# Altium footprint library RODION.PcbLib: 131 footprints (part 8 of 9)
Each footprint in its own frame and in the unit in brackets; x right, y up, seen from the top. Pads: shape width x height; smd on the part's side, far side on the other; paste and mask are expansions set on the pad; w line width, h text height; cw(c..) or ccw(c..) is an arc to the next point about the centre after c.
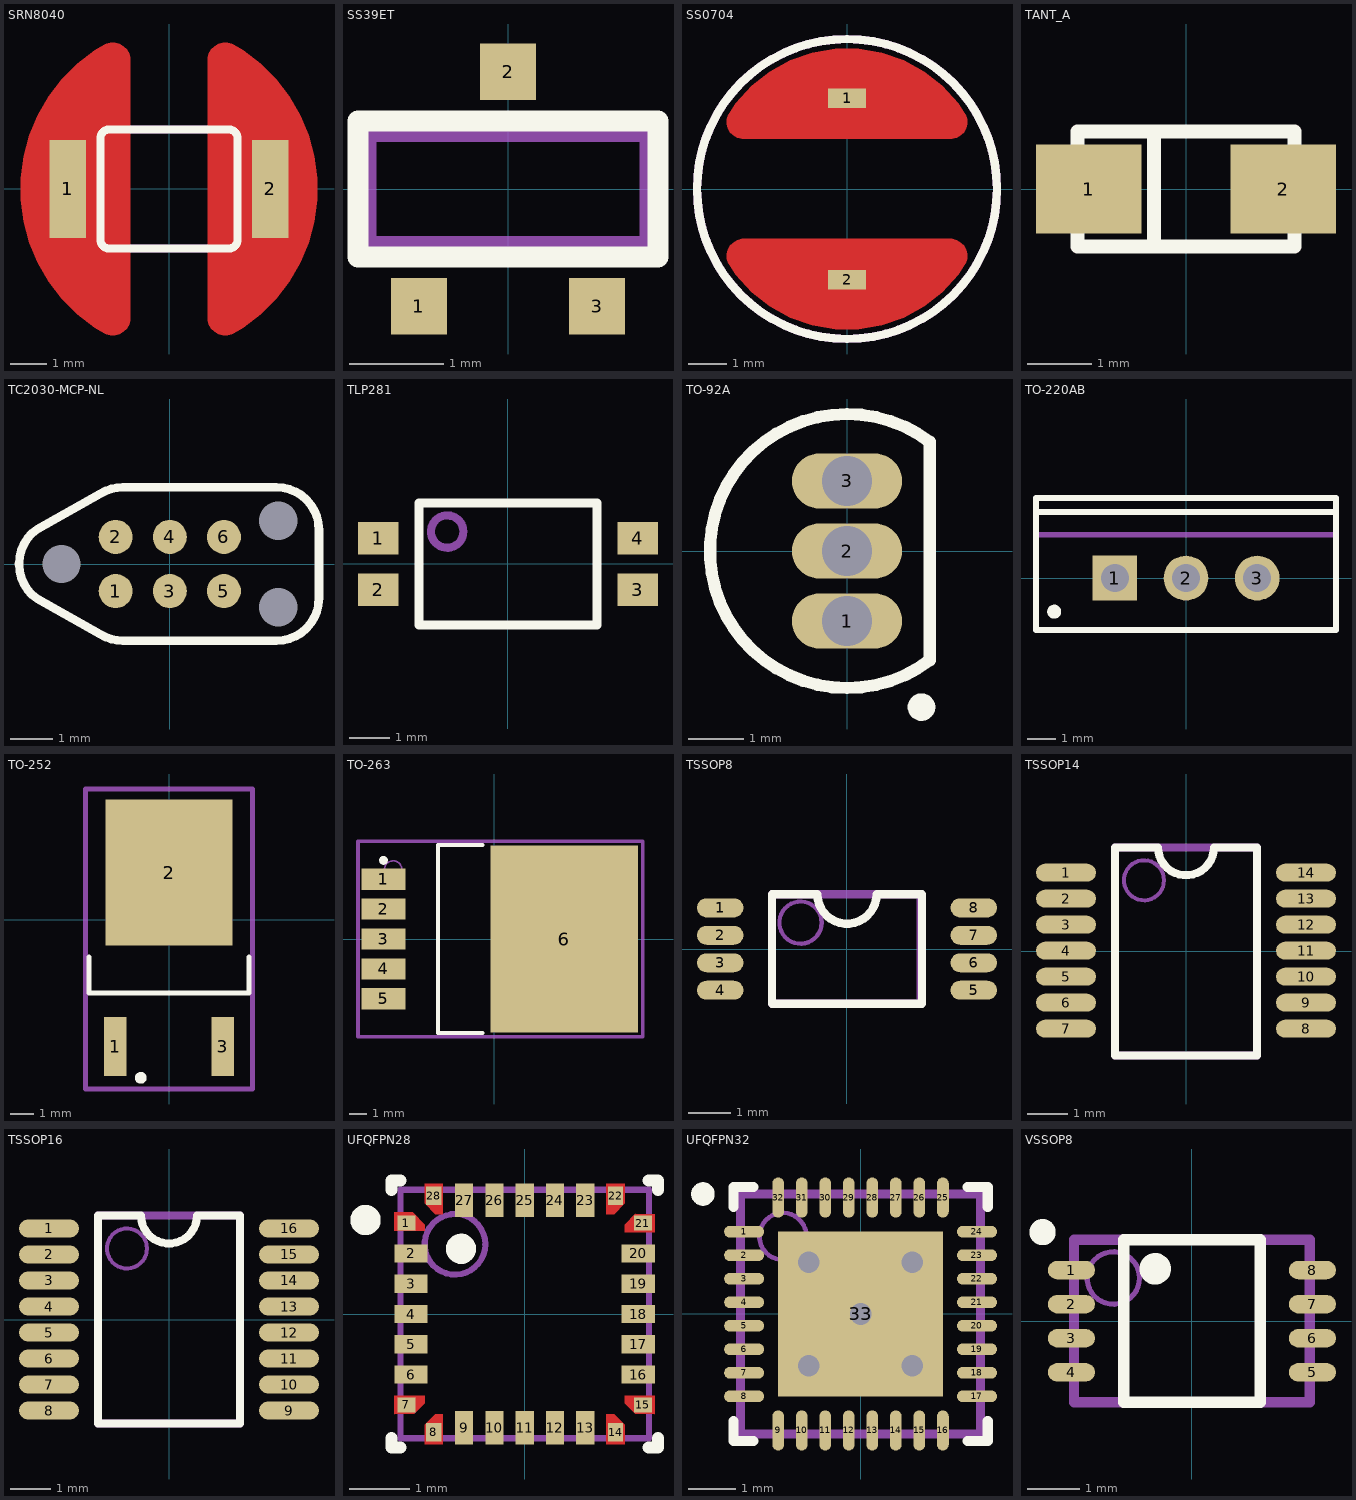
[diagram p7: the footprints below, top view; thin cyan lines are the x and y axes]

## SRN8040 [mm] "Chip Inductor, Body 8mm"
height 4
pads (2):
  rect 1x2.7 smd: 1(-2.8,0) 2(2.8,0)
Top Layer:
  region: 1.797,-3.985 2.059,-3.835 2.538,-3.468 2.964,-3.041 3.332,-2.563 3.634,-2.04 3.865,-1.483 4.021,-0.9 4.1,-0.302 4.1,0.302 4.021,0.9 3.865,1.483 3.634,2.04 3.332,2.563 2.964,3.041 2.538,3.468 2.059,3.835 1.797,3.985 1.742,4.017 1.619,4.05 1.492,4.05 1.37,4.017 1.26,3.953 1.17,3.863 1.106,3.753 1.073,3.631 1.073,3.567 1.073,-3.567 1.073,-3.631 1.106,-3.753 1.17,-3.863 1.26,-3.953 1.37,-4.017 1.492,-4.05 1.619,-4.05 1.742,-4.017
  region: -1.797,-3.985 -2.059,-3.835 -2.538,-3.468 -2.964,-3.041 -3.332,-2.563 -3.634,-2.04 -3.865,-1.483 -4.021,-0.9 -4.1,-0.302 -4.1,0.302 -4.021,0.9 -3.865,1.483 -3.634,2.04 -3.332,2.563 -2.964,3.041 -2.538,3.468 -2.059,3.835 -1.797,3.985 -1.742,4.017 -1.619,4.05 -1.492,4.05 -1.37,4.017 -1.26,3.953 -1.17,3.863 -1.106,3.753 -1.073,3.631 -1.073,3.567 -1.073,-3.567 -1.073,-3.631 -1.106,-3.753 -1.17,-3.863 -1.26,-3.953 -1.37,-4.017 -1.492,-4.05 -1.619,-4.05 -1.742,-4.017
Top Overlay:
  lines w0.22: -1.7,-1.65 1.7,-1.65 ; -1.7,1.65 1.7,1.65 ; -1.65,-1.65 cw(c-1.65,-1.4) -1.9,-1.4 -1.9,1.4 cw(c-1.65,1.4) -1.65,1.65 ; 1.65,-1.65 ccw(c1.65,-1.4) 1.9,-1.4 1.9,1.4 ccw(c1.65,1.4) 1.65,1.65
Top_Assy:
  lines w0.22: -1.7,-1.65 1.7,-1.65 ; -1.7,1.65 1.7,1.65 ; -1.65,-1.65 cw(c-1.65,-1.4) -1.9,-1.4 -1.9,1.4 cw(c-1.65,1.4) -1.65,1.65 ; 1.65,-1.65 ccw(c1.65,-1.4) 1.9,-1.4 1.9,1.4 ccw(c1.65,1.4) 1.65,1.65
  text ".Designator" at -1.5,-0.4 h1
3D body "SRN8040.step": height 4, standoff 0, extent -4.009,-4 4.009,4

## SS39ET [mm] "SOT23, 3-Leads, Body 2.9x1.6mm, Pitch 0.95mm, Lead Span 2.3mm - Reverse Pinning, IPC Medium Density"
height 1.4
pads (3):
  rect 0.6x0.6 smd: 1(-0.95,-1.25) 2(0,1.25) 3(0.95,-1.25)
Top Overlay:
  lines w0.22: -1.6,-0.725 -1.6,0.725 1.6,0.725 1.6,-0.725 -1.6,-0.725
Top_Assy:
  lines w0.2: -1.5,-0.6 1.5,-0.6 1.5,0.6 -1.5,0.6 -1.5,-0.6
  text ".Designator" at -1.85,-0.25 h1
3D body "SS39ET.step": height 1.31, standoff -0.01, extent -1.52,-1.5 1.52,1.5

## SS0704 [mm] "Chip Inductor, Body o7.5mm"
height 4
pads (2):
  rect 1x0.5 smd: 1(0,2.362) 2(0,-2.362)
Top Layer:
  region: -3.053,-1.982 -2.888,-2.236 -2.48,-2.682 -2.003,-3.054 -1.471,-3.343 -0.899,-3.54 -0.303,-3.64 0.303,-3.64 0.899,-3.54 1.471,-3.343 2.003,-3.054 2.48,-2.682 2.888,-2.236 3.053,-1.982 3.086,-1.932 3.122,-1.818 3.126,-1.699 3.099,-1.583 3.042,-1.478 2.96,-1.393 2.857,-1.332 2.742,-1.3 2.683,-1.3 -2.683,-1.3 -2.742,-1.3 -2.857,-1.332 -2.96,-1.393 -3.042,-1.478 -3.099,-1.583 -3.126,-1.699 -3.122,-1.818 -3.086,-1.932
  region: -3.053,1.982 -2.888,2.236 -2.48,2.682 -2.003,3.054 -1.471,3.343 -0.899,3.54 -0.303,3.64 0.303,3.64 0.899,3.54 1.471,3.343 2.003,3.054 2.48,2.682 2.888,2.236 3.053,1.982 3.086,1.932 3.122,1.818 3.126,1.699 3.099,1.583 3.042,1.478 2.96,1.393 2.857,1.332 2.742,1.3 2.683,1.3 -2.683,1.3 -2.742,1.3 -2.857,1.332 -2.96,1.393 -3.042,1.479 -3.099,1.583 -3.126,1.699 -3.122,1.818 -3.086,1.932
Top Overlay:
  circle w0.22: c0,0 r3.9
Top_Assy:
  circle w0.22: c0,0 r3.9
  text ".Designator" at -3.3,0.075 h1
3D body "SS0704.STEP": height 4, standoff 0, extent -3.75,-3.75 3.75,3.75

## TANT_A [mm] "TANT_A; 2 Leads"
height 1.6
pads (2):
  rect 1.65x1.4 smd: 1(-1.525,0) 2(1.525,0)
Top Overlay:
  lines w0.22: -1.7,-0.7 -1.7,-0.9 1.7,-0.9 1.7,-0.7 ; -1.7,0.7 -1.7,0.9 1.7,0.9 1.7,0.7 ; -0.5,-0.8 -0.5,0.8
Top_Assy:
  lines w0.2: -1.7,-0.7 -1.7,-0.9 1.7,-0.9 1.7,-0.7 ; -1.7,0.7 -1.7,0.9 1.7,0.9 1.7,0.7 ; -0.5,-0.8 -0.5,0.8
  text ".Designator" at -0.85,-0.175 h1
3D body "User Library-CaseA_3216-18.STEP": height 1.6, standoff 0, extent -1.6,-0.8 1.6,0.8

## TC2030-MCP-NL [mm] "Conector ICD en placa"
height 8
pads (9):
  round 0.8 smd paste-0.4: 1(-1.27,-0.635) 2(-1.27,0.635) 3(0,-0.635) 4(0,0.635) 5(1.27,-0.635) 6(1.27,0.635)
  round 0.85 hole 0.9 unplated mask+0: ""(-2.54,0) ""(2.54,-1.016) ""(2.54,1.016)
Top Overlay:
  lines w0.2: -3.111,-0.816 cw(c-2.544,0) -3.111,0.816 -1.63,1.648 cw(c-1.1,0.8) -1.1,1.8 2.5,1.8 cw(c2.5,0.8) 3.5,0.8 3.5,-0.8 cw(c2.5,-0.8) 2.5,-1.8 -1.1,-1.8 cw(c-1.1,-0.8) -1.63,-1.648 -3.111,-0.816
3D body: height 0, standoff 0, extent -3.539,-1.801 3.501,1.801

## TLP281 [mm] "Optic"
height 2
pads (4):
  rect 1x0.8 smd: 1(-3.2,0.635) 2(-3.2,-0.635) 3(3.2,-0.635) 4(3.2,0.635)
Top Overlay:
  lines w0.22: -2.2,-1.5 -2.2,1.5 2.2,1.5 2.2,-1.5 -2.2,-1.5
Top_Assy:
  circle w0.2: c-1.5,0.8 r0.4
  lines w0.2: -2.2,1.5 2.2,1.5 2.2,-1.5 -2.2,-1.5 -2.2,1.5 ; -2.2,1.5 -2.2,1.5
  text ".Designator" at -1.5,-0.8 h1
3D body "TLP281.STEP": height 1.89, standoff -0.01, extent -3.5,-1.3 3.5,1.3

## TO-92A [mm] "TO, Flat Index; 3 In-Line, Axial Leads; Body Dia. 4.5mm; Leads 0.51 x 0.48 mm (max)"
height 6.86
pads (3):
  oval 2x1 hole 0.9: 1(0,-1.27) 2(0,0) 3(0,1.27)
Top Overlay:
  circle w0.25: c1.35,-2.83 r0.125
  lines w0.22: 1.5,-1.98 cw(c0,0) 1.5,1.98 1.5,-1.98
Top_Assy:
  lines w0.1: 1.5,-1.98 cw(c0,0) 1.5,1.98
  lines w0.2: 1.5,-1.98 1.5,1.98
  text ".Designator" at -2.625,0.025 h1
3D body: height 6.86, standoff 2.2, extent -2.485,-2.495 1.501,2.495

## TO-220AB [mm] "TO, Thru-Hole, Vertical, Heatsink Mounted; 3 In-Line Leads; Pitch 2.54 mm"
height 19.3
pads (3):
  rect 1.6x1.6 hole 1: 1(-2.54,0)
  round 1.6 hole 1: 2(0,0) 3(2.54,0)
Top Overlay:
  circle w0.25: c-4.7,-1.2 r0.125
  lines w0.22: -5.35,2.35 5.35,2.35 ; -5.35,-1.85 -5.35,2.85 5.35,2.85 5.35,-1.85 -5.35,-1.85
Top_Assy:
  lines w0.2: -5.35,1.55 5.35,1.55 ; -5.35,-1.85 5.35,-1.85 5.35,2.85 -5.35,2.85 -5.35,-1.85
  text ".Designator" at -4.225,-0.15 h1
3D body: height 12.9, standoff 4, extent -5.4,-1.9 5.4,2.9
3D body: height 19.3, standoff 12.9, extent -5.349,1.551 5.349,2.849

## TO-252 [mm] "D-PAK, 4-Leads, Body 6.1x6.5mm, Pitch 2.28mm, Lead Span 9.7mm, IPC Medium Density"
height 2.4
pads (3):
  rect 0.95x2.5 smd: 1(-2.29,-5.4) 3(2.29,-5.4)
  rect 5.4x6.2 smd: 2(0,2)
Top Overlay:
  circle w0.25: c-1.2,-6.725 r0.125
  lines w0.22: -3.4,-1.6 -3.4,-3.125 3.4,-3.125 3.4,-1.6
Top_Assy:
  lines w0.2: -3.55,-7.2 3.55,-7.2 3.55,5.55 -3.55,5.55 -3.55,-7.2
  text ".Designator" at -1.975,-1.275 h1
3D body "DPAK TO-252.STEP": height 2.41, standoff 0, extent -3.27,-5.811 3.27,4.128

## TO-263 [mm] "D2-PAK, 6-Leads, Body 8.9x10.2mm, Pitch 1.7mm, Lead Span 15.2mm, IPC Medium Density"
height 4.83
pads (6):
  rect 2.5x1.2 smd: 1(-6.3,3.4) 2(-6.3,1.7) 3(-6.3,0) 4(-6.3,-1.7) 5(-6.3,-3.4)
  rect 8.4x10.65 smd: 6(4,0)
Top Overlay:
  circle w0.25: c-6.3,4.475 r0.125
  lines w0.22: -0.65,-5.35 -3.2,-5.35 -3.2,5.35 -0.65,5.35
Top_Assy:
  circle w0.1: c-5.75,3.95 r0.5
  lines w0.2: -7.75,-5.575 8.45,-5.575 8.45,5.575 -7.75,5.575 -7.75,-5.575
  text ".Designator" at -5.625,0.1 h1
3D body "DDPAK TO-263-5.STEP": height 4.87, standoff 0, extent -7.015,-5.08 7.215,5.08

## TSSOP8 [mm]
height 1.2
pads (8):
  oval 1.1x0.45 smd: 1(-3,0.975) 2(-3,0.325) 3(-3,-0.325) 4(-3,-0.975) 5(3,-0.975) 6(3,-0.325) 7(3,0.325) 8(3,0.975)
Top Overlay:
  lines w0.2: -1.775,-1.3 1.775,-1.3 1.775,1.3 0.7,1.3 cw(c0,1.3) -0.7,1.3 -1.775,1.3 -1.775,-1.3
Top_Assy:
  circle w0.1: c-1.1,0.625 r0.5
  lines w0.2: -1.775,-1.3 -1.775,1.3 1.75,1.3 1.75,-1.3 -1.775,-1.3
  text ".Designator" at -2.25,-0.025 h1
3D body "TSSOP8.step": height 1.11, standoff 0.02, extent -3.14,-1.6 3.14,1.4

## TSSOP14 [mm]
height 1.2
pads (14):
  oval 1.5x0.45 smd: 1(-3,1.965) 2(-3,1.315) 3(-3,0.665) 4(-3,0.015) 5(-3,-0.635) 6(-3,-1.285) 7(-3,-1.935) 8(3,-1.935) 9(3,-1.285) 10(3,-0.635) 11(3,0.015) 12(3,0.665) 13(3,1.315) 14(3,1.965)
Top Overlay:
  lines w0.2: -1.775,-2.6 1.775,-2.6 1.775,2.6 0.7,2.6 cw(c0,2.6) -0.7,2.6 -1.775,2.6 -1.775,-2.6
Top_Assy:
  circle w0.1: c-1.05,1.775 r0.5
  lines w0.2: -1.775,-2.6 1.775,-2.6 1.775,2.6 -1.775,2.6 -1.775,-2.6
  text ".Designator" at -1.25,-0.575 h1
3D body "TSSOP14.step": height 1.1, standoff 0, extent -3.225,-2.5 3.175,2.5

## TSSOP16 [mm]
height 1.2
pads (16):
  oval 1.5x0.45 smd: 1(-3,2.275) 2(-3,1.625) 3(-3,0.975) 4(-3,0.325) 5(-3,-0.325) 6(-3,-0.975) 7(-3,-1.625) 8(-3,-2.275) 9(3,-2.275) 10(3,-1.625) 11(3,-0.975) 12(3,-0.325) 13(3,0.325) 14(3,0.975) 15(3,1.625) 16(3,2.275)
Top Overlay:
  lines w0.2: -1.775,-2.6 -1.775,2.6 -0.7,2.6 ccw(c0,2.6) 0.7,2.6 1.775,2.6 1.775,-2.6 -1.775,-2.6
Top_Assy:
  circle w0.1: c-1.05,1.775 r0.5
  lines w0.2: -1.775,-2.6 -1.775,2.6 1.775,2.6 1.775,-2.6 -1.775,-2.6
  text ".Designator" at -1.25,-0.575 h1
3D body "TSSOP16.step": height 1.1, standoff 0, extent -3.225,-2.5 3.175,2.5

## UFQFPN28 [mm] "QFN, 28-Leads, Body 4.1x4.1mm, Pitch 0.5mm"
height 0.6
pads (28):
  rect 0.3x0.25 smd: 1(-1.95,1.5) 7(-1.95,-1.5) 15(1.95,-1.5) 21(1.95,1.5)
  rect 0.55x0.3 smd: 2(-1.875,1) 3(-1.875,0.5) 4(-1.875,0) 5(-1.875,-0.5) 6(-1.875,-1) 16(1.875,-1) 17(1.875,-0.5) 18(1.875,0) 19(1.875,0.5) 20(1.875,1)
  rect 0.25x0.3 smd: 8(-1.5,-1.95) 14(1.5,-1.95) 22(1.5,1.95) 28(-1.5,1.95)
  rect 0.3x0.55 smd: 9(-1,-1.875) 10(-0.5,-1.875) 11(0,-1.875) 12(0.5,-1.875) 13(1,-1.875) 23(1,1.875) 24(0.5,1.875) 25(0,1.875) 26(-0.5,1.875) 27(-1,1.875)
Top Layer:
  region: -2.15,-1.35 -1.65,-1.35 -1.65,-1.475 -1.825,-1.65 -2.15,-1.65
  region: -1.35,-2.15 -1.35,-1.65 -1.475,-1.65 -1.65,-1.825 -1.65,-2.15
  region: -1.35,2.15 -1.35,1.65 -1.475,1.65 -1.65,1.825 -1.65,2.15
  region: 1.35,-2.15 1.35,-1.65 1.475,-1.65 1.65,-1.825 1.65,-2.15
  region: 2.15,1.35 1.65,1.35 1.65,1.475 1.825,1.65 2.15,1.65
  region: -2.15,1.375 -1.65,1.375 -1.65,1.475 -1.85,1.675 -2.15,1.675
  region: 2.15,-1.35 1.65,-1.35 1.65,-1.475 1.825,-1.65 2.15,-1.65
  region: 1.35,2.15 1.35,1.65 1.475,1.65 1.65,1.825 1.65,2.15
Top Overlay:
  circle w0.25: c-1.05,1.075 r0.125
  circle w0.25: c-2.625,1.55 r0.125
  lines w0.2: -2.2,-2.047 -2.2,-2.2 -2.047,-2.2 ; -2.2,2.047 -2.2,2.2 -2.047,2.2 ; 2.047,-2.2 2.2,-2.2 2.2,-2.047 ; 2.047,2.2 2.2,2.2 2.2,2.047
Top_Assy:
  circle w0.1: c-1.15,1.15 r0.5
  lines w0.1: -2.05,-2.05 2.05,-2.05 2.05,2.05 -2.05,2.05 -2.05,-2.05
  text ".Designator" at -1.55,-0.825 h1
3D body "UFQFPN28 4x4.stp": height 0.58, standoff -0.02, extent -2.01,-2.01 2.01,2.01

## UFQFPN32 [mm] "QFN, 32-Leads, Body 5.1x5.1mm, Pitch 0.5mm, Thermal Pad 3.5x3.5mm, IPC Medium Density"
height 0.6
pads (33):
  oval 0.85x0.25 smd: 1(-2.475,1.75) 2(-2.475,1.25) 3(-2.475,0.75) 4(-2.475,0.25) 5(-2.475,-0.25) 6(-2.475,-0.75) 7(-2.475,-1.25) 8(-2.475,-1.75) 17(2.475,-1.75) 18(2.475,-1.25) 19(2.475,-0.75) 20(2.475,-0.25) 21(2.475,0.25) 22(2.475,0.75) 23(2.475,1.25) 24(2.475,1.75)
  oval 0.25x0.85 smd: 9(-1.75,-2.475) 10(-1.25,-2.475) 11(-0.75,-2.475) 12(-0.25,-2.475) 13(0.25,-2.475) 14(0.75,-2.475) 15(1.25,-2.475) 16(1.75,-2.475) 25(1.75,2.475) 26(1.25,2.475) 27(0.75,2.475) 28(0.25,2.475) 29(-0.25,2.475) 30(-0.75,2.475) 31(-1.25,2.475) 32(-1.75,2.475)
  rect 3.5x3.5 smd paste-5: 33(0,0)
via -1.1,1.1 diameter 1.016 hole 0.457
via 1.1,1.1 diameter 1.016 hole 0.457
via 0,0 diameter 1.016 hole 0.457
via -1.1,-1.1 diameter 1.016 hole 0.457
via 1.1,-1.1 diameter 1.016 hole 0.457
Top Overlay:
  circle w0.25: c-3.35,2.55 r0.125
  lines w0.22: -2.7,-2.275 -2.7,-2.7 -2.275,-2.7 ; -2.7,2.275 -2.7,2.7 -2.275,2.7 ; 2.275,-2.7 2.7,-2.7 2.7,-2.275 ; 2.275,2.7 2.7,2.7 2.7,2.275
Top Paste:
  rectangle: -1.425,-0.213 1.425,0.212
  rectangle: -1.425,-1.463 1.425,-1.038
  rectangle: -1.425,1.038 1.425,1.463
Top_Assy:
  circle w0.1: c-1.65,1.65 r0.5
  lines w0.2: -0.5,0 0.5,0 ; 0,-0.5 0,0.5 ; -2.55,-2.55 -2.55,2.55 2.55,2.55 2.55,-2.55 -2.55,-2.55
  text ".Designator" at -1.95,-1.675 h1
3D body "QFN-32 V6.stp": height 1.05, standoff 0, extent -2.5,-2.5 2.5,2.5

## VSSOP8 [mm] "SOP, 8-Leads, Body 4.4x3mm, Pitch 0.65mm, IPC Medium Density"
height 1.1
pads (8):
  oval 0.9x0.35 smd: 1(-2.3,0.975) 2(-2.3,0.325) 3(-2.3,-0.325) 4(-2.3,-0.975) 5(2.3,-0.975) 6(2.3,-0.325) 7(2.3,0.325) 8(2.3,0.975)
Top Overlay:
  circle w0.4: c-0.7,1 r0.1
  circle w0.25: c-2.85,1.7 r0.125
  lines w0.22: -1.3,-1.55 1.3,-1.55 1.3,1.55 -1.3,1.55 -1.3,-1.55
Top_Assy:
  circle w0.1: c-1.5,0.825 r0.5
  lines w0.2: -2.25,-1.55 2.25,-1.55 2.25,1.55 -2.25,1.55 -2.25,-1.55
  text ".Designator" at -2.05,-0.35 h1
3D body "User Library-S-PDSO-G8.STEP": height 0.94, standoff -0.02, extent -2.451,-1.499 2.451,1.498